# Altium footprint library 集大电协1.5.PcbLib: 283 footprints (part 14 of 18)
Each footprint in its own frame and in the unit in brackets; x right, y up, seen from the top. Pads: shape width x height; smd on the part's side, far side on the other; paste and mask are expansions set on the pad; w line width, h text height; cw(c..) or ccw(c..) is an arc to the next point about the centre after c.
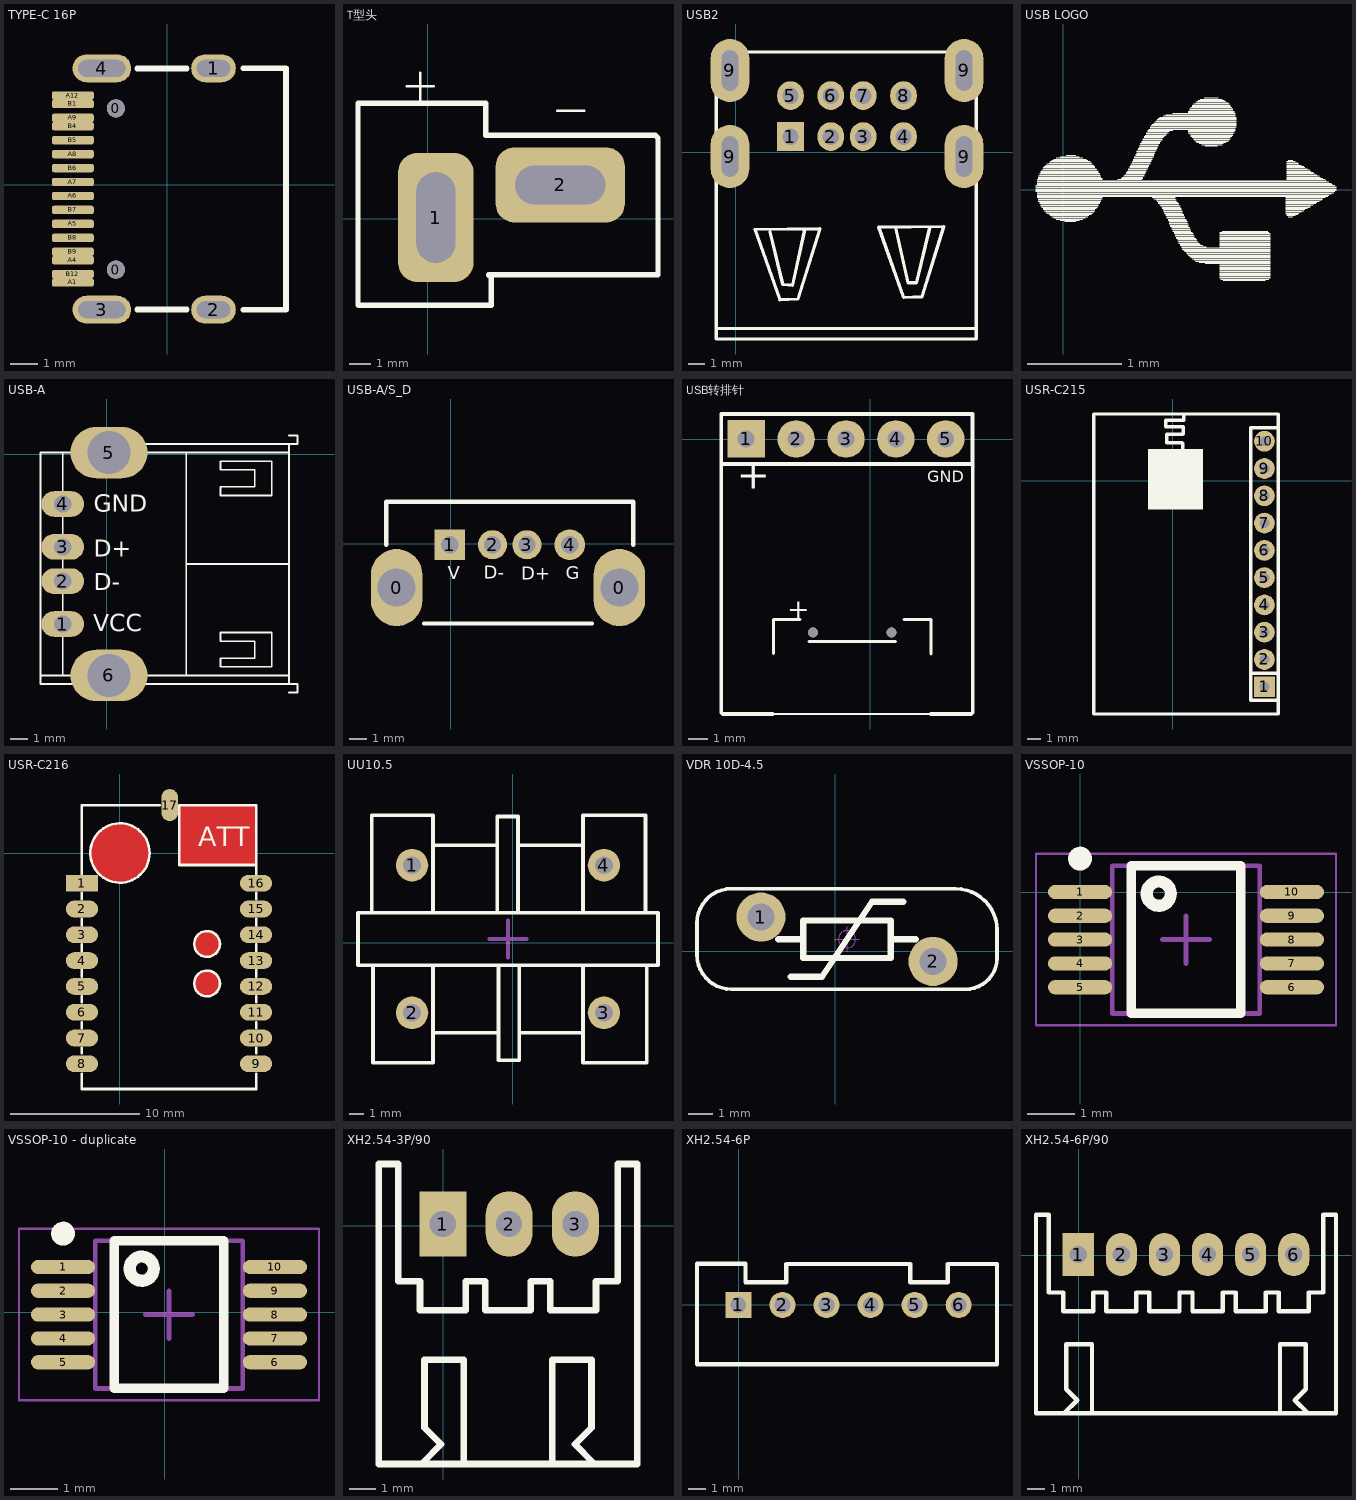
[diagram p13: the footprints below, top view; thin cyan lines are the x and y axes]

## TYPE-C 16P [mm] "贴片USB-3.1  4固定插脚"
pads (22):
  round 0.65 hole 0.65: 0(-1.834,-3.045) 0(-1.834,2.735)
  oval 1.6x1 hole 0.6 slot 1.2 at 0 deg: 1(1.666,4.17) 2(1.666,-4.48)
  oval 2.1x1 hole 0.6 slot 1.7 at 0 deg: 3(-2.334,-4.48) 4(-2.334,4.17)
  rrect50% 1.5x0.3 smd: A1(-3.374,-3.505) A4(-3.374,-2.705) A5(-3.374,-1.405) A6(-3.374,-0.405) A7(-3.374,0.095) A8(-3.374,1.095) A9(-3.374,2.395) A12(-3.374,3.195) B1(-3.374,2.895) B4(-3.374,2.095) B5(-3.374,1.595) B6(-3.374,0.595) B7(-3.374,-0.905) B8(-3.374,-1.905) B9(-3.374,-2.405) B12(-3.374,-3.205)
Top Overlay:
  lines w0.203: -1.073,-4.473 0.705,-4.473 ; -1.073,4.163 0.705,4.163 ; 2.737,-4.48 4.266,-4.48 4.266,4.17 2.737,4.17
3D body "USB Type-C_A.STEP": height 3.25, standoff -0.85, extent -3.446,-4.648 4.454,4.292

## T型头 [mm]
pads (2):
  rrect50% 3.5x6 hole 1.8 slot 4.2 at 90 deg: 1(0.373,0.053)
  rrect50% 6x3.5 hole 1.8 slot 4.2 at 0 deg: 2(6.157,1.566)
Top Overlay:
  lines w0.1: -0.986,6.154 0.284,6.154 ; -0.351,5.519 -0.351,6.789 ; 5.999,5.011 7.269,5.011
  lines w0.254: -3.243,-4.006 -3.243,5.366 2.697,5.366 2.697,3.868 10.571,3.868 10.698,3.741 10.698,-2.609 2.824,-2.609 2.951,-2.736 2.951,-4.034 -3.215,-4.034 -3.243,-4.006
3D body "User Library-Deans.step": height 14.1, standoff -4.9, extent -2.665,-3.157 9.335,4.143

## USB2 [mil]
pads (12):
  rect 65x70 hole 40: 1(133.11,38.86)
  oval 65x70 hole 40: 2(231.54,38.86) 3(310.28,38.86) 4(408.7,38.86) 5(133.11,138.86) 6(231.54,138.86) 7(310.28,138.86) 8(408.7,138.86)
  oval 94.49x153.54 hole 40 slot 98.43 at 90 deg: 9(-14.53,-9.84) 9(-14.53,200) 9(556.34,-9.84) 9(556.34,200)
Top Overlay:
  lines w7.87: -47.8,-429.05 586.11,-429.05 586.11,-432.74 ; 83.04,-193.18 114.37,-322.17 138.32,-324.01 167.8,-187.65 ; 388.94,-182.12 419.34,-317.57 440.53,-317.57 472.78,-183.04 ; -47.8,-454.85 586.11,-454.85 586.11,245.4 -47.8,245.4 -47.8,-454.85 ; 46.18,-187.65 204.66,-185.81 151.22,-357.18 106.99,-359.03 46.18,-187.65 ; 348.4,-182.12 506.87,-180.28 453.43,-351.66 409.21,-353.5 348.4,-182.12
3D body "USB A2.STEP": height 657.48, standoff -114.17, extent -29.09,-425.43 573.27,243.86

## USB LOGO [mm]
Top Overlay:
  drawing of 257 lines, arcs and shapes, not listed

## USB-A [mm]
pads (6):
  oval 2.5x1.5 hole 1: 1(-2.569,-9.89) 2(-2.569,-7.39) 3(-2.569,-5.39) 4(-2.569,-2.89)
  oval 4.5x3 hole 2.5: 5(0.131,0.11) 6(0.131,-12.89)
Top Overlay:
  lines w0.1: -3.869,-12.89 0.131,-12.89 ; -2.569,-12.89 -2.569,0.11 ; -0.869,0.61 10.631,0.61 ; 0.131,-13.39 0.131,-12.89 ; 0.131,0.61 0.131,0.11 10.631,0.11 -2.569,0.11 ; 4.631,-12.89 4.631,0.11 ; 4.631,-6.39 10.631,-6.39 10.631,0.61 ; 10.631,-13.89 11.131,-13.89 11.131,-13.39 10.631,-13.39 ; 10.631,-12.89 0.131,-12.89 ; 10.631,1.11 11.131,1.11 11.131,0.61 10.631,0.61 ; -2.569,0.11 -3.869,0.11 -3.869,-6.39 -3.869,-13.39 10.631,-13.39 ; 10.631,-13.39 10.631,0.61 ; 6.631,-12.39 6.631,-11.89 8.631,-11.89 8.631,-10.89 6.631,-10.89 6.631,-10.39 9.631,-10.39 9.631,-11.89 9.631,-12.39 6.631,-12.39 ; 6.631,-2.39 6.631,-1.89 8.631,-1.89 8.631,-0.89 6.631,-0.89 6.631,-0.39 9.631,-0.39 9.631,-1.89 9.631,-2.39 6.631,-2.39
  text "VCC" at -0.8,-10.325 h1
  text "GND" at -0.75,-3.35 h1
  text "D+" at -0.75,-5.975 h1
  text "D-" at -0.75,-7.925 h1
Bottom Overlay:
  lines w0.1: -3.869,-12.89 10.631,-12.89 ; -2.569,-12.89 -2.569,0.11 ; 4.631,-6.39 10.631,-6.39 ; 10.631,-13.89 11.131,-13.89 11.131,-13.39 -3.869,-13.39 -3.869,0.11 ; 10.631,-13.39 10.631,-12.89 ; 10.631,1.11 11.131,1.11 11.131,0.61 10.631,0.61 ; -3.869,0.11 -3.869,0.61 10.631,0.61 ; -3.869,0.11 10.631,0.11 10.631,0.61 ; 10.631,-12.89 10.631,0.61
3D body "USB-A_SA.STEP": height 6.8, standoff -4.31, extent -3.325,-13.742 10.98,0.942

## USB-A/S_D [mm]
pads (6):
  oval 3x4.5 hole 2.2: 0(-3.169,-2.548) 0(9.831,-2.548)
  rect 1.8x1.8 hole 1: 1(-0.069,-0.048)
  round 1.7 hole 1: 2(2.431,-0.048) 3(4.431,-0.048)
  round 1.8 hole 1: 4(6.931,-0.048)
Top Overlay:
  lines w0.254: -3.769,-0.048 -3.769,2.452 10.631,2.452 10.631,-0.048 ; -1.569,-4.648 8.231,-4.648
  text "D-" at 1.927,-2.029 h0.76
  text "D+" at 4.112,-2.08 h0.76
  text "G" at 6.702,-2.055 h0.76
  text "V" at -0.181,-2.055 h0.76
Mechanical 1:
  lines w0.254: -0.269,-0.248 cw(c-0.069,-0.248) -0.069,-0.048
3D body "USB-A_S-D.STEP": height 14, standoff -4, extent -3.713,-4.635 10.687,2.365

## USB转排针 [mm]
pads (7):
  rect 1.905x1.905 hole 0.864: 1(-6.316,0.014)
  round 1.905 hole 0.864: 2(-3.776,0.014) 3(-1.236,0.014) 4(1.304,0.014) 5(3.839,0.014)
  round 0.5 hole 0.5 unplated: ""(-2.923,-9.834) ""(1.077,-9.834)
Top Overlay:
  lines w0.1: -4.973,-13.984 3.077,-13.984
  lines w0.152: -4.923,-10.9 -4.923,-9.184 -3.573,-9.184 ; -3.123,-10.284 1.277,-10.284 ; 1.727,-9.184 3.077,-9.184 3.077,-10.934
  lines w0.2: -4.973,-13.984 -7.502,-13.984 -7.586,-13.9 -7.586,-1.256 ; 3.077,-13.984 5.13,-13.984 ; 5.214,-13.9 5.214,-1.256 ; -7.586,-1.256 5.2,-1.256 5.2,1.284 -7.586,1.284 -7.586,-1.256
  text "GND" at 2.9,-2.4 h1.02
  text "+" at -4.223,-9.134 h1
  text "+" at -6.8,-3 h2.54
3D body "MICRO-USB.stp": height 2.47, standoff -0.92, extent -4.875,-14.1 3.075,-8.324
3D body "HDR1X5_2.54mm.STEP": height 8.54, standoff -3, extent -7.591,-1.256 5.109,1.284

## USR-C215 [mil]
pads (10):
  rect 60x60 hole 28: 1(264.14,-593.99)
  round 60 hole 28: 2(264.14,-515.25) 3(264.14,-436.51) 4(264.14,-357.77) 5(264.14,-279.03) 6(264.14,-200.29) 7(264.14,-121.55) 8(264.14,-42.81) 9(264.14,35.93) 10(264.14,114.67)
Top Overlay:
  circle w10: c16.75,46.74 r32.8
  rectangle: -71.86,-81.99 86.14,92.01
  lines w10: 27.75,80.74 27.75,108.74 25.75,110.74 -18.25,110.74 -18.25,134.74 28.75,134.74 29.75,135.74 29.75,156.74 -20.25,156.74 -20.25,174.74 31.75,174.74 31.75,190.74 ; 224.77,-554.62 303.51,-554.62 ; -227.99,-672.73 303.51,-672.73 303.51,193.41 -227.99,193.41 -227.99,-672.73 ; 224.77,-633.36 303.51,-633.36 303.51,154.04 224.77,154.04 224.77,-633.36
3D body: height 40, standoff 10, extent -22.25,9.74 53.75,84.74
3D body: height 40, standoff 30, extent -72,-83 85,90
3D body: height 30, standoff 0, extent -227,-672 303,193

## USR-C216 [mm] "有人公司WIFI模组 USR-C216"
pads (17):
  rect 2.5x1.3 smd: 1(-2.945,-2.325)
  oval 2.5x1.3 smd: 2(-2.945,-4.325) 3(-2.945,-6.325) 4(-2.945,-8.325) 5(-2.945,-10.325) 6(-2.945,-12.325) 7(-2.945,-14.325) 8(-2.945,-16.325) 9(10.555,-16.325) 10(10.555,-14.325) 11(10.555,-12.325) 12(10.555,-10.325) 13(10.555,-8.325) 14(10.555,-6.325) 15(10.555,-4.325) 16(10.555,-2.325)
  oval 1.3x2.5 smd: 17(3.855,3.725)
Top Layer:
  pour cut-out: 6.755,-9.085 6.853,-9.085 7.047,-9.123 7.229,-9.199 7.392,-9.308 7.532,-9.448 7.641,-9.611 7.717,-9.793 7.755,-9.987 7.755,-10.085 7.755,-10.105 7.755,-10.203 7.717,-10.397 7.641,-10.579 7.532,-10.742 7.392,-10.882 7.229,-10.991 7.047,-11.067 6.853,-11.105 6.755,-11.105 6.657,-11.105 6.463,-11.067 6.281,-10.991 6.118,-10.882 5.978,-10.742 5.869,-10.579 5.793,-10.397 5.755,-10.203 5.755,-10.105 5.755,-10.085 5.755,-9.987 5.793,-9.793 5.869,-9.611 5.978,-9.448 6.118,-9.308 6.281,-9.199 6.463,-9.123 6.657,-9.085
  pour cut-out: 6.755,-6.035 6.853,-6.035 7.047,-6.073 7.229,-6.149 7.392,-6.258 7.532,-6.398 7.641,-6.561 7.717,-6.743 7.755,-6.937 7.755,-7.035 7.755,-7.133 7.717,-7.327 7.641,-7.509 7.532,-7.672 7.392,-7.812 7.229,-7.921 7.047,-7.997 6.853,-8.035 6.755,-8.035 6.657,-8.035 6.463,-7.997 6.281,-7.921 6.118,-7.812 5.978,-7.672 5.869,-7.509 5.793,-7.327 5.755,-7.133 5.755,-7.035 5.755,-7.025 5.755,-6.927 5.793,-6.736 5.868,-6.556 5.976,-6.394 6.114,-6.256 6.276,-6.148 6.456,-6.073 6.647,-6.035 6.745,-6.035
  pour cut-out: 4.611,3.725 4.611,-0.905 10.555,-0.905 10.555,3.725
  pour cut-out: 0.015,2.305 0.241,2.305 0.683,2.217 1.1,2.044 1.475,1.794 1.794,1.475 2.044,1.1 2.217,0.683 2.305,0.241 2.305,0.015 2.305,-0.212 2.217,-0.656 2.043,-1.074 1.792,-1.451 1.471,-1.772 1.094,-2.023 0.676,-2.197 0.232,-2.285 0.005,-2.285 -0.015,-2.285 -0.241,-2.285 -0.683,-2.197 -1.1,-2.024 -1.475,-1.774 -1.794,-1.455 -2.044,-1.08 -2.217,-0.663 -2.305,-0.221 -2.305,0.005 -2.305,0.025 -2.305,0.25 -2.217,0.69 -2.046,1.105 -1.796,1.478 -1.478,1.796 -1.105,2.046 -0.69,2.217 -0.25,2.305 -0.025,2.305
Top Overlay:
  circle w0.2: c6.755,-7.035 r1
  circle w0.2: c6.755,-10.095 r1
  circle w0.2: c0.005,0.015 r2.3
  lines w0.203: -2.945,-17.081 -2.945,-18.275 10.555,-18.275 10.555,-17.081 ; -2.945,-15.506 -2.945,-15.075 ; -2.945,-13.576 -2.945,-13.093 ; -2.945,-11.544 -2.945,-11.087 ; -2.945,-9.588 -2.945,-9.055 ; -2.945,-7.582 -2.945,-7.074 ; -2.945,-5.6 -2.945,-5.067 ; -2.945,-3.568 -2.945,-3.086 ; -2.945,-1.638 -2.945,3.725 3.087,3.725 ; 10.555,-15.506 10.555,-15.075 ; 10.555,-13.576 10.555,-13.093 ; 10.555,-11.544 10.555,-11.087 ; 10.555,-9.588 10.555,-9.055 ; 10.555,-7.582 10.555,-7.074 ; 10.555,-5.6 10.555,-5.067 ; 10.555,-3.568 10.555,-3.086 ; 10.555,-1.638 10.555,3.725 4.611,3.725 4.611,-0.915 10.555,-0.915
  text "ATT" at 6.059,0.525 h1.52
3D body: height 1, standoff 0, extent -3.035,-18.185 10.535,3.725
3D body "QFN-36B6R00x6R00.step": height 1.9, standoff 1, extent -0.561,-5.463 5.539,0.637
3D body "SOT23-5M.step": height 2.2, standoff 1, extent 4.95,-12.828 7.75,-9.828
3D body "QFN_18L 3.5 x 3.5.step": height 1.6, standoff 1, extent -0.453,-13.356 3.197,-9.706

## UU10.5 [mm] "18*16*20mm(长宽高）"
pads (4):
  round 2.2 hole 1.2: 1(-6.83,5.254) 2(-6.83,-4.746) 3(6.17,-4.746) 4(6.17,5.254)
Top Overlay:
  lines w0.254: -9.559,2.158 -9.559,8.636 -5.41,8.636 -5.41,2.158 ; -9.474,-1.556 -9.474,-8.128 -5.41,-8.128 -5.41,-1.556 ; -5.41,-6.096 -0.968,-6.096 ; -5.41,6.604 -1.053,6.604 ; -1.053,2.158 -1.053,8.558 0.347,8.558 0.347,2.158 ; -0.968,-1.556 -0.968,-7.956 0.432,-7.956 0.432,-1.556 ; 0.347,6.604 4.75,6.604 ; 0.432,-6.096 4.75,-6.096 ; 4.75,-1.65 4.75,-8.128 9.068,-8.128 9.068,-1.65 ; 4.75,2.158 4.75,8.636 8.983,8.636 8.983,2.158 ; -10.49,-1.524 9.83,-1.524 9.83,2.032 -10.49,2.032 -10.49,-1.524
Mechanical 15:
  lines w0.254: -1.6,0.254 0.94,0.254 ; -0.33,-1.016 -0.33,1.524
3D body "UU10.5.STEP": height 21.05, standoff -3.45, extent -9.73,-7.746 9.07,8.254

## VDR 10D-4.5 [mm] "压敏电阻10mm*4.5mm(直径*厚度）"
pads (2):
  round 2 hole 1.1: 1(-3.017,1.383) 2(3.983,-0.417)
Top Overlay:
  lines w0.152: -5.613,-0.152 ccw(c-4.216,-0.152) -4.216,-1.549 5.309,-1.549 ccw(c5.309,-0.279) 6.579,-0.279 6.579,0.859 ccw(c4.904,0.859) 4.904,2.534 -4.223,2.534 ccw(c-4.223,1.143) -5.613,1.143 -5.613,-0.152
  lines w0.254: -2.311,0.483 -1.295,0.483 ; -1.803,-1.041 -0.533,-1.041 1.499,2.007 2.769,2.007 ; 2.261,0.483 3.277,0.483 ; -1.295,-0.279 -1.295,1.245 2.261,1.245 2.261,-0.279 -1.295,-0.279
Mechanical 15:
  circle w0.05: c0.483,0.483 r0.35
  lines w0.05: -0.017,0.483 0.983,0.483 ; 0.483,-0.017 0.483,0.983
3D body "10D361.STEP": height 13.5, standoff -4, extent -5.517,-1.517 6.483,2.483

## VSSOP-10 [mm]
pads (10):
  oval 1.35x0.3 smd: 1(0,0.008) 2(0,-0.492) 3(0,-0.992) 4(0,-1.492) 5(0,-1.992) 6(4.45,-1.992) 7(4.45,-1.492) 8(4.45,-0.992) 9(4.45,-0.492) 10(4.45,0.008)
Top Overlay:
  circle w0.25: c0,0.708 r0.125
  circle w0.254: c1.653,-0.028 r0.254
  lines w0.2: 1.075,-2.542 3.375,-2.542 3.375,0.558 1.075,0.558 1.075,-2.542
Mechanical 13:
  lines w0.1: 0.675,-2.542 3.775,-2.542 3.775,0.558 0.675,0.558 0.675,-2.542
Mechanical 15:
  lines w0.05: -0.925,-2.792 5.375,-2.792 5.375,0.808 -0.925,0.808 -0.925,-2.792
  lines w0.1: 1.725,-0.992 2.725,-0.992 ; 2.225,-1.492 2.225,-0.492
3D body "User Library-DGS0010A.STEP": height 1.1, standoff 0, extent -0.237,-2.475 4.688,0.525

## VSSOP-10 - duplicate [mm]
pads (10):
  oval 1.35x0.3 smd: 1(-2.134,0.948) 2(-2.134,0.448) 3(-2.134,-0.052) 4(-2.134,-0.552) 5(-2.134,-1.052) 6(2.316,-1.052) 7(2.316,-0.552) 8(2.316,-0.052) 9(2.316,0.448) 10(2.316,0.948)
Top Overlay:
  circle w0.25: c-2.134,1.648 r0.125
  circle w0.254: c-0.481,0.912 r0.254
  lines w0.2: -1.059,-1.602 1.241,-1.602 1.241,1.498 -1.059,1.498 -1.059,-1.602
Mechanical 13:
  lines w0.1: -1.459,-1.602 1.641,-1.602 1.641,1.498 -1.459,1.498 -1.459,-1.602
Mechanical 15:
  lines w0.05: -3.059,-1.852 3.241,-1.852 3.241,1.748 -3.059,1.748 -3.059,-1.852
  lines w0.1: -0.409,-0.052 0.591,-0.052 ; 0.091,-0.552 0.091,0.448
3D body "User Library-DGS0010A.STEP": height 1.1, standoff 0, extent -2.371,-1.535 2.554,1.465

## XH2.54-3P/90 [mm]
pads (3):
  rect 1.8x2.5 hole 1: 1(-0.02,0.065)
  oval 1.8x2.5 hole 1: 2(2.52,0.065) 3(5.06,0.065)
Top Overlay:
  lines w0.254: -0.81,-9.107 -0.083,-8.381 -0.72,-7.744 -0.72,-5.135 0.78,-5.135 0.78,-9.135 ; 4.18,-9.135 4.18,-5.135 5.68,-5.135 5.68,-7.744 5.044,-8.381 5.77,-9.107 ; -2.47,-9.135 7.43,-9.135 7.43,2.365 6.68,2.365 6.68,-2.135 5.855,-2.135 5.855,-3.235 4.105,-3.235 4.105,-2.135 3.355,-2.135 3.355,-3.235 1.605,-3.235 1.605,-2.135 0.855,-2.135 0.855,-3.235 -0.895,-3.235 -0.895,-2.135 -1.72,-2.135 -1.72,2.365 -2.47,2.365 -2.47,-9.135
3D body "JST-S3B-XH-A.STEP": height 6.1, standoff -3.4, extent -2.47,-9.135 7.43,2.365

## XH2.54-6P [mm]
pads (6):
  rect 1.5x1.5 hole 0.9: 1(-0.018,-0.022)
  round 1.5 hole 0.9: 2(2.522,-0.022) 3(5.062,-0.022) 4(7.602,-0.022) 5(10.142,-0.022) 6(12.682,-0.022)
Top Overlay:
  lines w0.254: -2.406,-3.451 -2.406,2.366 0.388,2.366 0.388,1.299 2.75,1.299 2.75,2.34 9.888,2.34 9.888,1.299 12.047,1.299 12.047,2.34 14.891,2.34 14.891,-3.451 -2.406,-3.451
3D body "6pin-2.5.step": height 7, standoff -3.4, extent -2.495,-3.405 14.905,2.345

## XH2.54-6P/90 [mm]
pads (6):
  rect 1.8x2.5 hole 1: 1(-0.015,0.035)
  oval 1.8x2.5 hole 1: 2(2.485,0.035) 3(4.985,0.035) 4(7.485,0.035) 5(9.985,0.035) 6(12.485,0.035)
Top Overlay:
  lines w0.254: -0.805,-9.137 -0.079,-8.41 -0.715,-7.774 -0.715,-5.165 0.785,-5.165 0.785,-9.165 ; 11.685,-9.165 11.685,-5.165 13.185,-5.165 13.185,-7.774 12.548,-8.41 13.275,-9.137 ; -2.465,-9.165 14.935,-9.165 14.935,2.335 14.185,2.335 14.185,-2.165 13.36,-2.165 13.36,-3.265 11.61,-3.265 11.61,-2.165 10.86,-2.165 10.86,-3.265 9.11,-3.265 9.11,-2.165 8.36,-2.165 8.36,-3.265 6.61,-3.265 6.61,-2.165 5.86,-2.165 5.86,-3.265 4.11,-3.265 4.11,-2.165 3.36,-2.165 3.36,-3.265 1.61,-3.265 1.61,-2.165 0.86,-2.165 0.86,-3.265 -0.89,-3.265 -0.89,-2.165 -1.715,-2.165 -1.715,2.335 -2.465,2.335 -2.465,-9.165
3D body "JST-S6B-XH-A.STEP": height 6.1, standoff -3.4, extent -2.465,-9.165 14.935,2.335